# Altium integrated library Tact_Switches_rev15a.intlib: 108 symbols (continued)
## WE-Tact Switches WS-TASV 431183015816
designator SW?
WS-TASV SMD Tact Switch 5X5 mm with ground terminal; Manufacturer: Würth Elektronik eiSos GmbH & Co.KG; ComponentLink1 Description: Manufacturer; ComponentLink2 Description: Datasheet; Creat by: Karrer Zheng; NoPins: 04; Creat Date: 5 March February 2014; partNo: 431183015816; ComponentLink1URL: http://www.we-online.com; ComponentLink2URL: http://katalog.we-online.de/em/datasheet/431183015816.pdf
footprint 431183015816
pins: 1, 2, 3, 4, 5, 6
text: GND


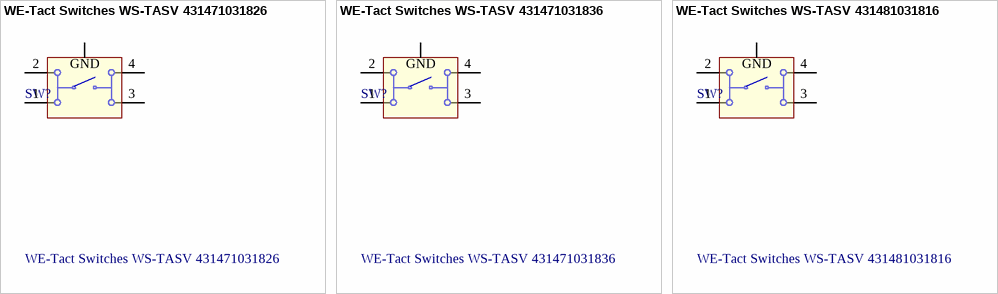
[diagram p10: symbols WE-Tact Switches WS-TASV 431471031826 to WE-Tact Switches WS-TASV 431481031816]

## WE-Tact Switches WS-TASV 431471031826
designator SW?
WS-TASV SMD Tact Switch 6X6 mm with ground terminal; Manufacturer: Würth Elektronik eiSos GmbH & Co.KG; ComponentLink1 Description: Manufacturer; ComponentLink2 Description: Datasheet; Creat by: Karrer Zheng; NoPins: 04; Creat Date: 4 March February 2014; partNo: 431471031826; ComponentLink1URL: http://www.we-online.com; ComponentLink2URL: http://katalog.we-online.de/em/datasheet/431471031826.pdf
footprint 431471031826 (6*6mm vertical type, SMD, height 3.1mm, white actuator, 260gf, Grounded Terminal, T&R)
pins: 1, 2, 3, 4, 5
text: GND

## WE-Tact Switches WS-TASV 431471031836
designator SW?
WS-TASV SMD Tact Switch 6X6 mm with ground terminal; Manufacturer: Würth Elektronik eiSos GmbH & Co.KG; ComponentLink1 Description: Manufacturer; ComponentLink2 Description: Datasheet; Creat by: Karrer Zheng; NoPins: 04; Creat Date: 4 March February 2014; partNo: 431471031836; ComponentLink1URL: http://www.we-online.com; ComponentLink2URL: http://katalog.we-online.de/em/datasheet/431471031836.pdf
footprint 431471031836 (6*6mm vertical type, SMD, height 3.1mm, salmon actuator, 360gf, Grounded Terminal, T&R)
pins: 1, 2, 3, 4, 5
text: GND

## WE-Tact Switches WS-TASV 431481031816
designator SW?
WS-TASV SMD Tact Switch 6X6 mm with ground terminal; Manufacturer: Würth Elektronik eiSos GmbH & Co.KG; ComponentLink1 Description: Manufacturer; ComponentLink2 Description: Datasheet; Creat by: Karrer Zheng; NoPins: 04; Creat Date: 4 March February 2014; partNo: 431481031816; ComponentLink1URL: http://www.we-online.com; ComponentLink2URL: http://katalog.we-online.de/em/datasheet/431481031816.pdf
footprint 431481031816 (6*6mm vertical type, SMD, height 3.1mm, black actuator, 160gf, Grounded Terminal, T&R)
pins: 1, 2, 3, 4, 5
text: GND


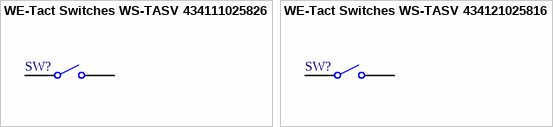
[diagram p11: symbols WE-Tact Switches WS-TASV 434111025826 to WE-Tact Switches WS-TASV 434121025816]

## WE-Tact Switches WS-TASV 434111025826
designator SW?
WS-TASV SMD Tact Switch 6.0X3.8 mm; Manufacturer: Würth Elektronik eiSos GmbH & Co.KG; ComponentLink1 Description: Manufacturer; ComponentLink2 Description: Datasheet; Creat by: Karrer Zheng; NoPins: 02; Creat Date: 6 March February 2014; partNo: 434111025826; ComponentLink1URL: http://www.we-online.com; ComponentLink2URL: http://katalog.we-online.de/em/datasheet/434111025826.pdf
footprint 434111025826 (6.0*3.8mm vertical type, SMD,  height 2.5mm, white actuator, 260gf, T&R)
pins: 1, 2

## WE-Tact Switches WS-TASV 434121025816
designator SW?
WS-TASV SMD Tact Switch 6.0X3.8 mm; Manufacturer: Würth Elektronik eiSos GmbH & Co.KG; ComponentLink1 Description: Manufacturer; ComponentLink2 Description: Datasheet; Creat by: Karrer Zheng; NoPins: 02; Creat Date: 6 March February 2014; partNo: 434121025816; ComponentLink1URL: http://www.we-online.com; ComponentLink2URL: http://katalog.we-online.de/em/datasheet/434121025816.pdf
footprint 434121025816 (6.0*3.8mm vertical type, SMD, height 2.5mm, black actuator, 160gf, T&R)
pins: 1, 2


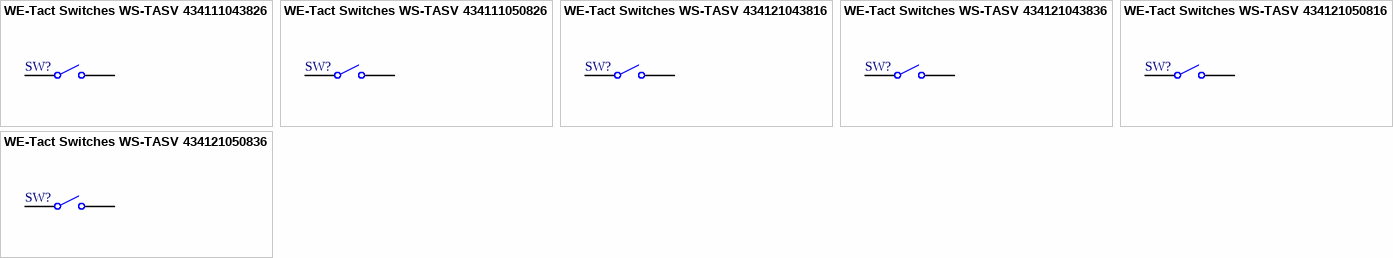
[diagram p12: symbols WE-Tact Switches WS-TASV 434111043826 to WE-Tact Switches WS-TASV 434121050836]

## WE-Tact Switches WS-TASV 434111043826
designator SW?
WS-TASV SMD Tact Switch 6.0X3.5 mm; Manufacturer: Würth Elektronik eiSos GmbH & Co.KG; ComponentLink1 Description: Manufacturer; ComponentLink2 Description: Datasheet; Creat by: Karrer Zheng; NoPins: 02; Creat Date: 5 March February 2014; partNo: 434111043826; ComponentLink1URL: http://www.we-online.com; ComponentLink2URL: http://katalog.we-online.de/em/datasheet/434111043826.pdf
footprint 434111043826
pins: 1, 2

## WE-Tact Switches WS-TASV 434111050826
designator SW?
WS-TASV SMD Tact Switch 6.0X3.5 mm; Manufacturer: Würth Elektronik eiSos GmbH & Co.KG; ComponentLink1 Description: Manufacturer; ComponentLink2 Description: Datasheet; Creat by: Karrer Zheng; NoPins: 02; Creat Date: 5 March February 2014; partNo: 434111050826; ComponentLink1URL: http://www.we-online.com; ComponentLink2URL: http://katalog.we-online.de/em/datasheet/434111050826.pdf
footprint 434111050826
pins: 1, 2

## WE-Tact Switches WS-TASV 434121043816
designator SW?
WS-TASV SMD Tact Switch 6.0X3.5 mm; Manufacturer: Würth Elektronik eiSos GmbH & Co.KG; ComponentLink1 Description: Manufacturer; ComponentLink2 Description: Datasheet; Creat by: Karrer Zheng; NoPins: 02; Creat Date: 5 March February 2014; partNo: 434121043816; ComponentLink1URL: http://www.we-online.com; ComponentLink2URL: http://katalog.we-online.de/em/datasheet/434121043816.pdf
footprint 434121043816
pins: 1, 2

## WE-Tact Switches WS-TASV 434121043836
designator SW?
WS-TASV SMD Tact Switch 6.0X3.5 mm; Manufacturer: Würth Elektronik eiSos GmbH & Co.KG; ComponentLink1 Description: Manufacturer; ComponentLink2 Description: Datasheet; Creat by: Karrer Zheng; NoPins: 02; Creat Date: 5 March February 2014; partNo: 434121043836; ComponentLink1URL: http://www.we-online.com; ComponentLink2URL: http://katalog.we-online.de/em/datasheet/434121043836.pdf
footprint 434121043836
pins: 1, 2

## WE-Tact Switches WS-TASV 434121050816
designator SW?
WS-TASV SMD Tact Switch 6.0X3.5 mm; Manufacturer: Würth Elektronik eiSos GmbH & Co.KG; ComponentLink1 Description: Manufacturer; ComponentLink2 Description: Datasheet; Creat by: Karrer Zheng; NoPins: 02; Creat Date: 5 March February 2014; partNo: 434121050816; ComponentLink1URL: http://www.we-online.com; ComponentLink2URL: http://katalog.we-online.de/em/datasheet/434121050816.pdf
footprint 434121050816
pins: 1, 2

## WE-Tact Switches WS-TASV 434121050836
designator SW?
WS-TASV SMD Tact Switch 6.0X3.5 mm; Manufacturer: Würth Elektronik eiSos GmbH & Co.KG; ComponentLink1 Description: Manufacturer; ComponentLink2 Description: Datasheet; Creat by: Karrer Zheng; NoPins: 04; Creat Date: 5 March February 2014; partNo: 434121050836; ComponentLink1URL: http://www.we-online.com; ComponentLink2URL: http://katalog.we-online.de/em/datasheet/434121050836.pdf
footprint 434121050836
pins: 1, 2


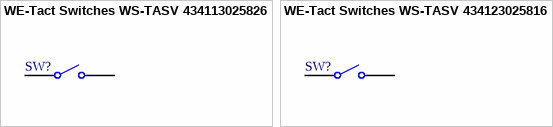
[diagram p13: symbols WE-Tact Switches WS-TASV 434113025826 to WE-Tact Switches WS-TASV 434123025816]

## WE-Tact Switches WS-TASV 434113025826
designator SW?
WS-TASV J-Bend SMD Tact Switch 6.0X3.8 mm; Manufacturer: Würth Elektronik eiSos GmbH & Co.KG; ComponentLink1 Description: Manufacturer; ComponentLink2 Description: Datasheet; Creat by: Karrer Zheng; NoPins: 02; Creat Date: 6 March February 2014; partNo: 434113025826; ComponentLink1URL: http://www.we-online.com; ComponentLink2URL: http://katalog.we-online.de/em/datasheet/434113025826.pdf
footprint 434113025826
pins: 1, 2

## WE-Tact Switches WS-TASV 434123025816
designator SW?
WS-TASV J-Bend SMD Tact Switch 6.0X3.8 mm; Manufacturer: Würth Elektronik eiSos GmbH & Co.KG; ComponentLink1 Description: Manufacturer; ComponentLink2 Description: Datasheet; Creat by: Karrer Zheng; NoPins: 02; Creat Date: 6 March February 2014; partNo: 434123025816; ComponentLink1URL: http://www.we-online.com; ComponentLink2URL: http://katalog.we-online.de/em/datasheet/434123025816.pdf
footprint 434123025816
pins: 1, 2


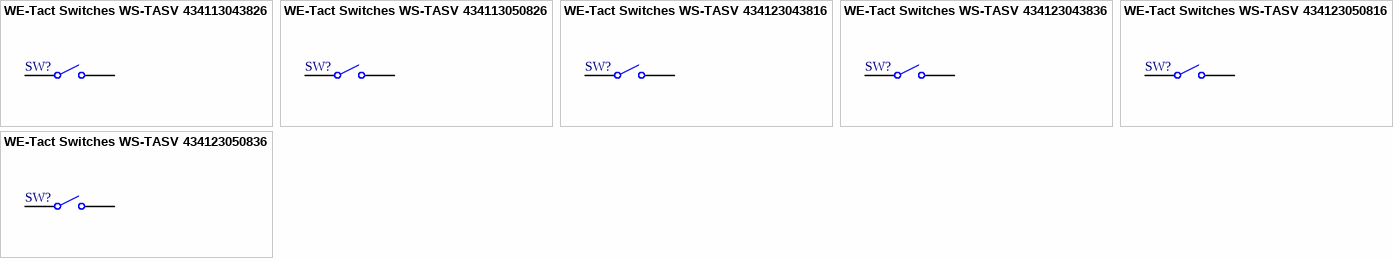
[diagram p14: symbols WE-Tact Switches WS-TASV 434113043826 to WE-Tact Switches WS-TASV 434123050836]

## WE-Tact Switches WS-TASV 434113043826
designator SW?
WS-TASV J-Bend SMD Tact Switch 6.0X3.5 mm; Manufacturer: Würth Elektronik eiSos GmbH & Co.KG; ComponentLink1 Description: Manufacturer; ComponentLink2 Description: Datasheet; Creat by: Karrer Zheng; NoPins: 02; Creat Date: 5 March February 2014; partNo: 434113043826; ComponentLink1URL: http://www.we-online.com; ComponentLink2URL: http://katalog.we-online.de/em/datasheet/434113043826.pdf
footprint 434113043826 (6.0*3.5mm vertical type, J-Bend SMD, height 4.3mm, white actuator, 260gf, T&R)
pins: 1, 2

## WE-Tact Switches WS-TASV 434113050826
designator SW?
WS-TASV J-Bend SMD Tact Switch 6.0X3.5 mm; Manufacturer: Würth Elektronik eiSos GmbH & Co.KG; ComponentLink1 Description: Manufacturer; ComponentLink2 Description: Datasheet; Creat by: Karrer Zheng; NoPins: 02; Creat Date: 5 March February 2014; partNo: 434113050826; ComponentLink1URL: http://www.we-online.com; ComponentLink2URL: http://katalog.we-online.de/em/datasheet/434113050826.pdf
footprint 434113050826 (6.0*3.5mm vertical type, J-Bend SMD, height 5.0mm, white actuator, 260gf, T&R)
pins: 1, 2

## WE-Tact Switches WS-TASV 434123043816
designator SW?
WS-TASV J-Bend SMD Tact Switch 6.0X3.5 mm; Manufacturer: Würth Elektronik eiSos GmbH & Co.KG; ComponentLink1 Description: Manufacturer; ComponentLink2 Description: Datasheet; Creat by: Karrer Zheng; NoPins: 02; Creat Date: 5 March February 2014; partNo: 434123043816; ComponentLink1URL: http://www.we-online.com; ComponentLink2URL: http://katalog.we-online.de/em/datasheet/434123043816.pdf
footprint 434123043816 (6.0*3.5mm vertical type, J-Bend SMD, height 4.3mm, black actuator, 160gf, T&R)
pins: 1, 2

## WE-Tact Switches WS-TASV 434123043836
designator SW?
WS-TASV J-Bend SMD Tact Switch 6.0X3.5 mm; Manufacturer: Würth Elektronik eiSos GmbH & Co.KG; ComponentLink1 Description: Manufacturer; ComponentLink2 Description: Datasheet; Creat by: Karrer Zheng; NoPins: 02; Creat Date: 5 March February 2014; partNo: 434123043836; ComponentLink1URL: http://www.we-online.com; ComponentLink2URL: http://katalog.we-online.de/em/datasheet/434123043836.pdf
footprint 434123043836 (6.0*3.5mm vertical type, J-Bend SMD,  height 4.3mm, salmon actuator, 360gf, T&R)
pins: 1, 2

## WE-Tact Switches WS-TASV 434123050816
designator SW?
WS-TASV J-Bend SMD Tact Switch 6.0X3.5 mm; Manufacturer: Würth Elektronik eiSos GmbH & Co.KG; ComponentLink1 Description: Manufacturer; ComponentLink2 Description: Datasheet; Creat by: Karrer Zheng; NoPins: 02; Creat Date: 5 March February 2014; partNo: 434123050816; ComponentLink1URL: http://www.we-online.com; ComponentLink2URL: http://katalog.we-online.de/em/datasheet/434123050816.pdf
footprint 434123050816 (6.0*3.5mm vertical type, J-Bend SMD, height 5.0mm, black actuator, 160gf, T&R)
pins: 1, 2

## WE-Tact Switches WS-TASV 434123050836
designator SW?
WS-TASV J-Bend SMD Tact Switch 6.0X3.5 mm; Manufacturer: Würth Elektronik eiSos GmbH & Co.KG; ComponentLink1 Description: Manufacturer; ComponentLink2 Description: Datasheet; Creat by: Karrer Zheng; NoPins: 02; Creat Date: 5 March February 2014; partNo: 434123050836; ComponentLink1URL: http://www.we-online.com; ComponentLink2URL: http://katalog.we-online.de/em/datasheet/434123050836.pdf
footprint 434123050836 (6.0*3.5mm vertical type, J-Bend SMD, height 5.0mm, salmon actuator, 360gf, T&R)
pins: 1, 2


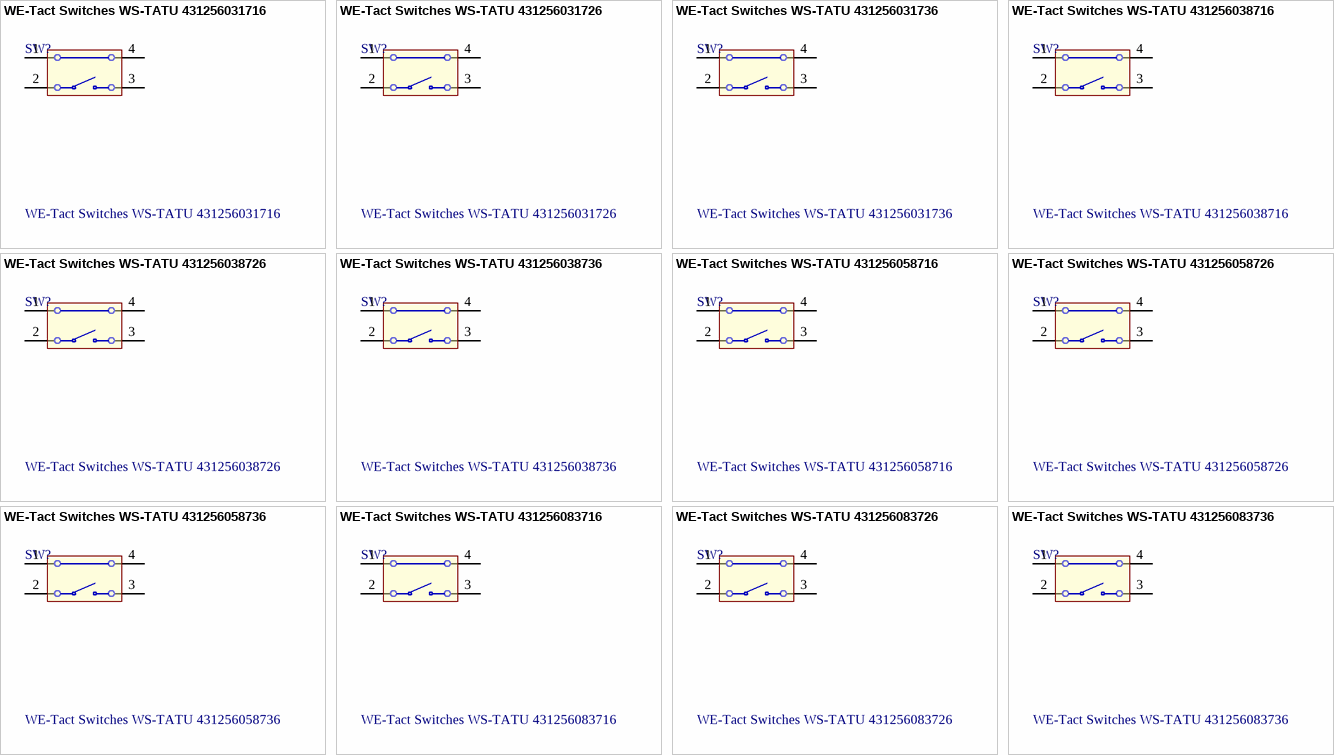
[diagram p15: symbols WE-Tact Switches WS-TATU 431256031716 to WE-Tact Switches WS-TATU 431256083736]

## WE-Tact Switches WS-TATU 431256031716
designator SW?
WS-TATU THT Tact Switch 6X6 mm right angle type with ground terminal; Manufacturer: Würth Elektronik eiSos GmbH & Co.KG; ComponentLink1 Description: Manufacturer; ComponentLink2 Description: Datasheet; Creat by: Karrer Zheng; NoPins: 04; Creat Date: 03 March 2014; partNo: 431256031716; ComponentLink1URL: http://www.we-online.com; ComponentLink2URL: http://katalog.we-online.de/em/datasheet/43125603x.pdf
footprint 431256031716 (6*6mm right-angled,THT, height 3.15mm, black actuator, 160gf, Bulk)
pins: 1, 2, 3, 4

## WE-Tact Switches WS-TATU 431256031726
designator SW?
WS-TATU THT Tact Switch 6X6 mm right angle type with ground terminal; Manufacturer: Würth Elektronik eiSos GmbH & Co.KG; ComponentLink1 Description: Manufacturer; ComponentLink2 Description: Datasheet; Creat by: Karrer Zheng; NoPins: 04; Creat Date: 03 March 2014; partNo: 431256031726; ComponentLink1URL: http://www.we-online.com; ComponentLink2URL: http://katalog.we-online.de/em/datasheet/43125603x.pdf
footprint 431256031726 (6*6mm right-angled,THT, height 3.15mm, white actuator, 260gf, Bulk)
pins: 1, 2, 3, 4

## WE-Tact Switches WS-TATU 431256031736
designator SW?
WS-TATU THT Tact Switch 6X6 mm right angle type with ground terminal; Manufacturer: Würth Elektronik eiSos GmbH & Co.KG; ComponentLink1 Description: Manufacturer; ComponentLink2 Description: Datasheet; Creat by: Karrer Zheng; NoPins: 04; Creat Date: 03 March 2014; partNo: 431256031736; ComponentLink1URL: http://www.we-online.com; ComponentLink2URL: http://katalog.we-online.de/em/datasheet/43125603x.pdf
footprint 431256031736 (6*6mm right-angled,THT, height 3.15mm, salmon actuator, 360gf, Bulk)
pins: 1, 2, 3, 4

## WE-Tact Switches WS-TATU 431256038716
designator SW?
WS-TATU THT Tact Switch 6X6 mm right angle type with ground terminal; Manufacturer: Würth Elektronik eiSos GmbH & Co.KG; ComponentLink1 Description: Manufacturer; ComponentLink2 Description: Datasheet; Creat by: Karrer Zheng; NoPins: 04; Creat Date: 03 March 2014; partNo: 431256038716; ComponentLink1URL: http://www.we-online.com; ComponentLink2URL: http://katalog.we-online.de/em/datasheet/43125603x.pdf
footprint 431256038716 (6*6mm right-angled,THT, height 3.85mm, black actuator, 160gf, Bulk)
pins: 1, 2, 3, 4

## WE-Tact Switches WS-TATU 431256038726
designator SW?
WS-TATU THT Tact Switch 6X6 mm right angle type with ground terminal; Manufacturer: Würth Elektronik eiSos GmbH & Co.KG; ComponentLink1 Description: Manufacturer; ComponentLink2 Description: Datasheet; Creat by: Karrer Zheng; NoPins: 04; Creat Date: 03 March 2014; partNo: 431256038726; ComponentLink1URL: http://www.we-online.com; ComponentLink2URL: http://katalog.we-online.de/em/datasheet/43125603x.pdf
footprint 431256038726 (6*6mm right-angled,THT, height 3.85mm, white actuator, 260gf, Bulk)
pins: 1, 2, 3, 4

## WE-Tact Switches WS-TATU 431256038736
designator SW?
WS-TATU THT Tact Switch 6X6 mm right angle type with ground terminal; Manufacturer: Würth Elektronik eiSos GmbH & Co.KG; ComponentLink1 Description: Manufacturer; ComponentLink2 Description: Datasheet; Creat by: Karrer Zheng; NoPins: 04; Creat Date: 03 March 2014; partNo: 431256038736; ComponentLink1URL: http://www.we-online.com; ComponentLink2URL: http://katalog.we-online.de/em/datasheet/43125603x.pdf
footprint 431256038736 (6*6mm right-angled,THT, height 3.85mm, salmon actuator, 360gf, Bulk)
pins: 1, 2, 3, 4

## WE-Tact Switches WS-TATU 431256058716
designator SW?
WS-TATU THT Tact Switch 6X6 mm right angle type with ground terminal; Manufacturer: Würth Elektronik eiSos GmbH & Co.KG; ComponentLink1 Description: Manufacturer; ComponentLink2 Description: Datasheet; Creat by: Karrer Zheng; NoPins: 04; Creat Date: 03 March 2014; partNo: 431256058716; ComponentLink1URL: http://www.we-online.com; ComponentLink2URL: http://katalog.we-online.de/em/datasheet/43125603x.pdf
footprint 431256058716 (6*6mm right angle Tact switch,THT, height 5.85mm, black actuator, 160gf, Bulk)
pins: 1, 2, 3, 4

## WE-Tact Switches WS-TATU 431256058726
designator SW?
WS-TATU THT Tact Switch 6X6 mm right angle type with ground terminal; Manufacturer: Würth Elektronik eiSos GmbH & Co.KG; ComponentLink1 Description: Manufacturer; ComponentLink2 Description: Datasheet; Creat by: Karrer Zheng; NoPins: 04; Creat Date: 03 March 2014; partNo: 431256058726; ComponentLink1URL: http://www.we-online.com; ComponentLink2URL: http://katalog.we-online.de/em/datasheet/43125603x.pdf
footprint 431256058726 (6*6mm right angle Tact switch,THT, height 5.85mm, white actuator, 260gf, Bulk)
pins: 1, 2, 3, 4

## WE-Tact Switches WS-TATU 431256058736
designator SW?
WS-TATU THT Tact Switch 6X6 mm right angle type with ground terminal; Manufacturer: Würth Elektronik eiSos GmbH & Co.KG; ComponentLink1 Description: Manufacturer; ComponentLink2 Description: Datasheet; Creat by: Karrer Zheng; NoPins: 04; Creat Date: 03 March 2014; partNo: 431256058736; ComponentLink1URL: http://www.we-online.com; ComponentLink2URL: http://katalog.we-online.de/em/datasheet/43125603x.pdf
footprint 431256058736 (6*6mm right angle Tact switch,THT, height 5.85mm, salmon actuator, 360gf, Bulk)
pins: 1, 2, 3, 4

## WE-Tact Switches WS-TATU 431256083716
designator SW?
WS-TATU THT Tact Switch 6X6 mm right angle type with ground terminal; Manufacturer: Würth Elektronik eiSos GmbH & Co.KG; ComponentLink1 Description: Manufacturer; ComponentLink2 Description: Datasheet; Creat by: Karrer Zheng; NoPins: 04; Creat Date: 03 March 2014; partNo: 431256083716; ComponentLink1URL: http://www.we-online.com; ComponentLink2URL: http://katalog.we-online.de/em/datasheet/43125603x.pdf
footprint 431256083716 (6*6mm right angle Tact switch,THT, height 8.35mm, black actuator, 160gf, Bulk)
pins: 1, 2, 3, 4

## WE-Tact Switches WS-TATU 431256083726
designator SW?
WS-TATU THT Tact Switch 6X6 mm right angle type with ground terminal; Manufacturer: Würth Elektronik eiSos GmbH & Co.KG; ComponentLink1 Description: Manufacturer; ComponentLink2 Description: Datasheet; Creat by: Karrer Zheng; NoPins: 04; Creat Date: 03 March 2014; partNo: 431256083726; ComponentLink1URL: http://www.we-online.com; ComponentLink2URL: http://katalog.we-online.de/em/datasheet/43125603x.pdf
footprint 431256083726 (6*6mm right angle Tact switch,THT, height 8.35mm, white actuator, 260gf, Bulk)
pins: 1, 2, 3, 4

## WE-Tact Switches WS-TATU 431256083736
designator SW?
WS-TATU THT Tact Switch 6X6 mm right angle type with ground terminal; Manufacturer: Würth Elektronik eiSos GmbH & Co.KG; ComponentLink1 Description: Manufacturer; ComponentLink2 Description: Datasheet; Creat by: Karrer Zheng; NoPins: 04; Creat Date: 03 March 2014; partNo: 431256083736; ComponentLink1URL: http://www.we-online.com; ComponentLink2URL: http://katalog.we-online.de/em/datasheet/43125603x.pdf
footprint 431256083736 (6*6mm right angle Tact switch,THT, height 8.35mm, salmon actuator, 360gf, Bulk)
pins: 1, 2, 3, 4


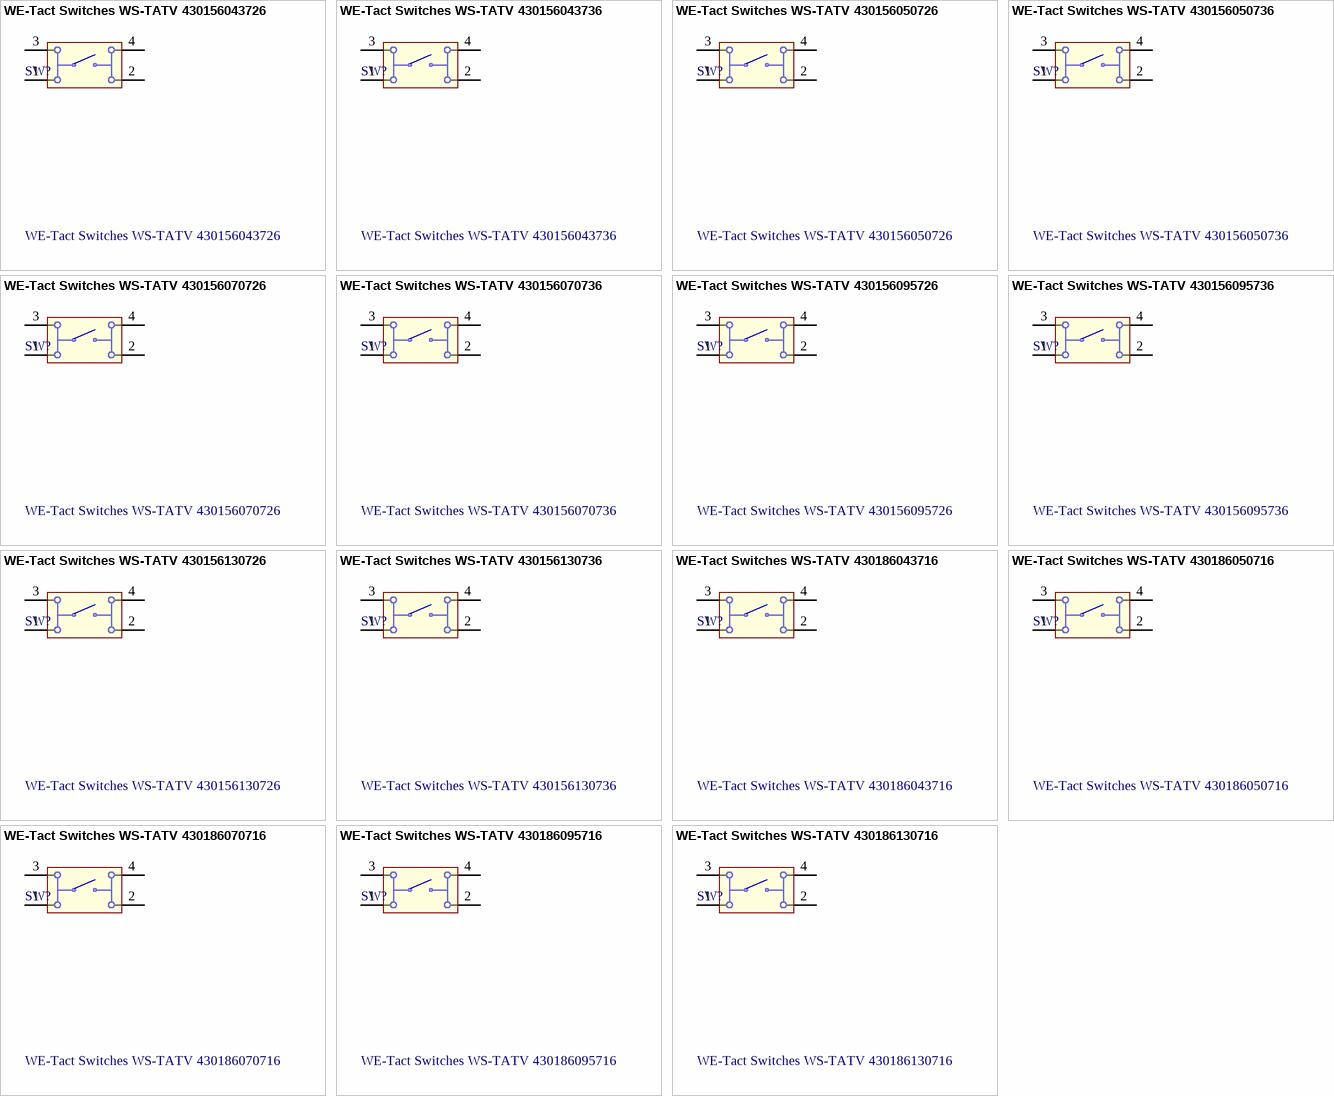
[diagram p16: symbols WE-Tact Switches WS-TATV 430156043726 to WE-Tact Switches WS-TATV 430186130716]

## WE-Tact Switches WS-TATV 430156043726
designator SW?
WS-TATV THT Tact Switch 6X6 mm; Manufacturer: Würth Elektronik eiSos GmbH & Co.KG; ComponentLink1 Description: Manufacturer; ComponentLink2 Description: Datasheet; Creat by: Karrer Zheng; NoPins: 04; Creat Date: 03 March 2014; partNo: 430156043726; ComponentLink1URL: http://www.we-online.com; ComponentLink2URL: http://katalog.we-online.de/em/datasheet/4301x6.pdf
footprint 430156043726 (6*6mm vertical type, THT, height 4.3mm, white actuator, 260gf, Bulk)
pins: 1, 2, 3, 4

## WE-Tact Switches WS-TATV 430156043736
designator SW?
WS-TATV THT Tact Switch 6X6 mm; Manufacturer: Würth Elektronik eiSos GmbH & Co.KG; ComponentLink1 Description: Manufacturer; ComponentLink2 Description: Datasheet; Creat by: Karrer Zheng; NoPins: 04; Creat Date: 03 March 2014; partNo: 430156043736; ComponentLink1URL: http://www.we-online.com; ComponentLink2URL: http://katalog.we-online.de/em/datasheet/4301x6.pdf
footprint 430156043736 (6*6mm vertical type, THT, height 4.3mm, salmon actuator 360gf, Bulk)
pins: 1, 2, 3, 4

## WE-Tact Switches WS-TATV 430156050726
designator SW?
WS-TATV THT Tact Switch 6X6 mm; Manufacturer: Würth Elektronik eiSos GmbH & Co.KG; ComponentLink1 Description: Manufacturer; ComponentLink2 Description: Datasheet; Creat by: Karrer Zheng; NoPins: 04; Creat Date: 03 March 2014; partNo: 430156050726; ComponentLink1URL: http://www.we-online.com; ComponentLink2URL: http://katalog.we-online.de/em/datasheet/4301x6.pdf
footprint 430156050726 (6*6mm vertical type, THT, height 5.0mm, white actuator, 260gf, Bulk)
pins: 1, 2, 3, 4

## WE-Tact Switches WS-TATV 430156050736
designator SW?
WS-TATV THT Tact Switch 6X6 mm; Manufacturer: Würth Elektronik eiSos GmbH & Co.KG; ComponentLink1 Description: Manufacturer; ComponentLink2 Description: Datasheet; Creat by: Karrer Zheng; NoPins: 04; Creat Date: 03 March 2014; partNo: 430156050736; ComponentLink1URL: http://www.we-online.com; ComponentLink2URL: http://katalog.we-online.de/em/datasheet/4301x6.pdf
footprint 430156050736 (6*6mm vertical type, THT, height 5.0mm, salmon actuator, 360gf, Bulk)
pins: 1, 2, 3, 4

## WE-Tact Switches WS-TATV 430156070726
designator SW?
WS-TATV THT Tact Switch 6X6 mm; Manufacturer: Würth Elektronik eiSos GmbH & Co.KG; ComponentLink1 Description: Manufacturer; ComponentLink2 Description: Datasheet; Creat by: Karrer Zheng; NoPins: 04; Creat Date: 03 March 2014; partNo: 430156070726; ComponentLink1URL: http://www.we-online.com; ComponentLink2URL: http://katalog.we-online.de/em/datasheet/4301x6.pdf
footprint 430156070726 (6*6mm vertical type, THT, height 7.0mm, white actuator, 260gf, Bulk)
pins: 1, 2, 3, 4

## WE-Tact Switches WS-TATV 430156070736
designator SW?
WS-TATV THT Tact Switch 6X6 mm; Manufacturer: Würth Elektronik eiSos GmbH & Co.KG; ComponentLink1 Description: Manufacturer; ComponentLink2 Description: Datasheet; Creat by: Karrer Zheng; NoPins: 04; Creat Date: 03 March 2014; partNo: 430156070736; ComponentLink1URL: http://www.we-online.com; ComponentLink2URL: http://katalog.we-online.de/em/datasheet/4301x6.pdf
footprint 430156070736 (6*6mm vertical type, THT, height 7.0mm, salmon actuator, 360gf, Bulk)
pins: 1, 2, 3, 4

## WE-Tact Switches WS-TATV 430156095726
designator SW?
WS-TATV THT Tact Switch 6X6 mm; Manufacturer: Würth Elektronik eiSos GmbH & Co.KG; ComponentLink1 Description: Manufacturer; ComponentLink2 Description: Datasheet; Creat by: Karrer Zheng; NoPins: 04; Creat Date: 03 March 2014; partNo: 430156095726; ComponentLink1URL: http://www.we-online.com; ComponentLink2URL: http://katalog.we-online.de/em/datasheet/4301x6.pdf
footprint 430156095726 (6*6mm vertical type, THT, height 9.5mm, white actuator, 260gf, Bulk)
pins: 1, 2, 3, 4

## WE-Tact Switches WS-TATV 430156095736
designator SW?
WS-TATV THT Tact Switch 6X6 mm; Manufacturer: Würth Elektronik eiSos GmbH & Co.KG; ComponentLink1 Description: Manufacturer; ComponentLink2 Description: Datasheet; Creat by: Karrer Zheng; NoPins: 04; Creat Date: 03 March 2014; partNo: 430156095736; ComponentLink1URL: http://www.we-online.com; ComponentLink2URL: http://katalog.we-online.de/em/datasheet/4301x6.pdf
footprint 430156095736 (6*6mm vertical type, THT, height 9.5mm, salmon actuator, 360gf, Bulk)
pins: 1, 2, 3, 4

## WE-Tact Switches WS-TATV 430156130726
designator SW?
WS-TATV THT Tact Switch 6X6 mm; Manufacturer: Würth Elektronik eiSos GmbH & Co.KG; ComponentLink1 Description: Manufacturer; ComponentLink2 Description: Datasheet; Creat by: Karrer Zheng; NoPins: 04; Creat Date: 03 March 2014; partNo: 430156130726; ComponentLink1URL: http://www.we-online.com; ComponentLink2URL: http://katalog.we-online.de/em/datasheet/4301x6.pdf
footprint 430156130726 (6*6mm vertical type, THT, height 13.0mm, white actuator, 260gf, Bulk)
pins: 1, 2, 3, 4

## WE-Tact Switches WS-TATV 430156130736
designator SW?
WS-TATV THT Tact Switch 6X6 mm; Manufacturer: Würth Elektronik eiSos GmbH & Co.KG; ComponentLink1 Description: Manufacturer; ComponentLink2 Description: Datasheet; Creat by: Karrer Zheng; NoPins: 04; Creat Date: 03 March 2014; partNo: 430156130736; ComponentLink1URL: http://www.we-online.com; ComponentLink2URL: http://katalog.we-online.de/em/datasheet/4301x6.pdf
footprint 430156130736 (6*6mm vertical type, THT, height 13.0mm, salmon actuator, 360gf, Bulk)
pins: 1, 2, 3, 4

## WE-Tact Switches WS-TATV 430186043716
designator SW?
WS-TATV THT Tact Switch 6X6 mm; Manufacturer: Würth Elektronik eiSos GmbH & Co.KG; ComponentLink1 Description: Manufacturer; ComponentLink2 Description: Datasheet; Creat by: Karrer Zheng; NoPins: 04; Creat Date: 03 March 2014; partNo: 430186043716; ComponentLink1URL: http://www.we-online.com; ComponentLink2URL: http://katalog.we-online.de/em/datasheet/4301x6.pdf
footprint 430186043716 (6*6mm vertical type, THT, height 4.3mm, black actuator, 160gf, Bulk)
pins: 1, 2, 3, 4

## WE-Tact Switches WS-TATV 430186050716
designator SW?
WS-TATV THT Tact Switch 6X6 mm; Manufacturer: Würth Elektronik eiSos GmbH & Co.KG; ComponentLink1 Description: Manufacturer; ComponentLink2 Description: Datasheet; Creat by: Karrer Zheng; NoPins: 04; Creat Date: 03 March 2014; partNo: 430186050716; ComponentLink1URL: http://www.we-online.com; ComponentLink2URL: http://katalog.we-online.de/em/datasheet/4301x6.pdf
footprint 430186050716 (6*6mm vertical type, THT, height 5.0mm, black actuator, 160gf, Bulk)
pins: 1, 2, 3, 4

## WE-Tact Switches WS-TATV 430186070716
designator SW?
WS-TATV THT Tact Switch 6X6 mm; Manufacturer: Würth Elektronik eiSos GmbH & Co.KG; ComponentLink1 Description: Manufacturer; ComponentLink2 Description: Datasheet; Creat by: Karrer Zheng; NoPins: 04; Creat Date: 03 March 2014; partNo: 430186070716; ComponentLink1URL: http://www.we-online.com; ComponentLink2URL: http://katalog.we-online.de/em/datasheet/4301x6.pdf
footprint 430186070716 (6*6mm vertical type, THT, height 7.0mm, black actuator, 160gf, Bulk)
pins: 1, 2, 3, 4

## WE-Tact Switches WS-TATV 430186095716
designator SW?
WS-TATV THT Tact Switch 6X6 mm; Manufacturer: Würth Elektronik eiSos GmbH & Co.KG; ComponentLink1 Description: Manufacturer; ComponentLink2 Description: Datasheet; Creat by: Karrer Zheng; NoPins: 04; Creat Date: 03 March 2014; partNo: 430186095716; ComponentLink1URL: http://www.we-online.com; ComponentLink2URL: http://katalog.we-online.de/em/datasheet/4301x6.pdf
footprint 430186095716 (6*6mm vertical type, THT, height 9.5mm, black actuator, 160gf, Bulk)
pins: 1, 2, 3, 4

## WE-Tact Switches WS-TATV 430186130716
designator SW?
WS-TATV THT Tact Switch 6X6 mm; Manufacturer: Würth Elektronik eiSos GmbH & Co.KG; ComponentLink1 Description: Manufacturer; ComponentLink2 Description: Datasheet; Creat by: Karrer Zheng; NoPins: 04; Creat Date: 03 March 2014; partNo: 430186130716; ComponentLink1URL: http://www.we-online.com; ComponentLink2URL: http://katalog.we-online.de/em/datasheet/4301x6.pdf
footprint 430186130716 (6*6mm vertical type, THT, height 13.0mm, black actuator, 160gf, Bulk)
pins: 1, 2, 3, 4


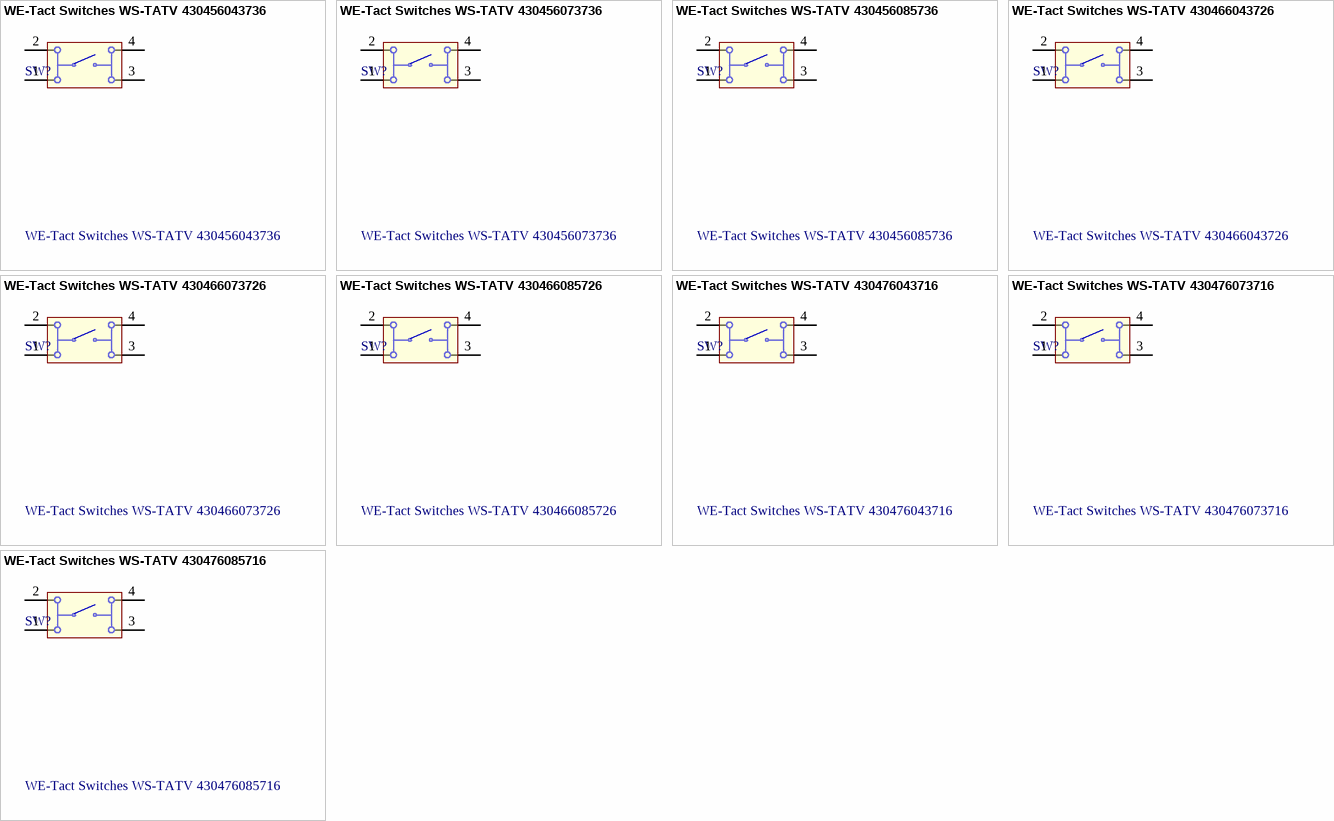
[diagram p17: symbols WE-Tact Switches WS-TATV 430456043736 to WE-Tact Switches WS-TATV 430476085716]

## WE-Tact Switches WS-TATV 430456043736
designator SW?
WS-TATV THT Tact Switch 12X12 mm; Manufacturer: Würth Elektronik eiSos GmbH & Co.KG; ComponentLink1 Description: Manufacturer; ComponentLink2 Description: Datasheet; Creat by: Karrer Zheng; NoPins: 04; Creat Date: 28 February 2014; partNo: 430456043736; ComponentLink1URL: http://www.we-online.com; ComponentLink2URL: http://katalog.we-online.de/em/datasheet/430456043736.pdf
footprint 430456043736 (12*12mm vertical type,THT,  height 4.3mm, salmon actuator, 360gf, Bulk)
pins: 1, 2, 3, 4

## WE-Tact Switches WS-TATV 430456073736
designator SW?
WS-TATV THT Tact Switch 12X12 mm; Manufacturer: Würth Elektronik eiSos GmbH & Co.KG; ComponentLink1 Description: Manufacturer; ComponentLink2 Description: Datasheet; Creat by: Karrer Zheng; NoPins: 04; Creat Date: 28 February 2014; partNo: 430456073736; ComponentLink1URL: http://www.we-online.com; ComponentLink2URL: http://katalog.we-online.de/em/datasheet/430456073736.pdf
footprint 430456073736 (12*12mm vertical type,THT,  height 7.3mm, square salmon actuator, 360gf, Bulk)
pins: 1, 2, 3, 4

## WE-Tact Switches WS-TATV 430456085736
designator SW?
WS-TATV THT Tact Switch 12X12 mm; Manufacturer: Würth Elektronik eiSos GmbH & Co.KG; ComponentLink1 Description: Manufacturer; ComponentLink2 Description: Datasheet; Creat by: Karrer Zheng; NoPins: 04; Creat Date: 28 February 2014; partNo: 430456085736; ComponentLink1URL: http://www.we-online.com; ComponentLink2URL: http://katalog.we-online.de/em/datasheet/430456085736.pdf
footprint 430456085736 (12*12mm vertical type,THT,  height 8.5mm, salmon actuator, 360gf, Bulk)
pins: 1, 2, 3, 4

## WE-Tact Switches WS-TATV 430466043726
designator SW?
WS-TATV THT Tact Switch 12X12 mm; Manufacturer: Würth Elektronik eiSos GmbH & Co.KG; ComponentLink1 Description: Manufacturer; ComponentLink2 Description: Datasheet; Creat by: Karrer Zheng; NoPins: 04; Creat Date: 28 February 2014; partNo: 430466043726; ComponentLink1URL: http://www.we-online.com; ComponentLink2URL: http://katalog.we-online.de/em/datasheet/430466043726.pdf
footprint 430466043726 (12*12mm vertical type,THT,  height 4.3mm, white actuator, 260gf, Bulk)
pins: 1, 2, 3, 4

## WE-Tact Switches WS-TATV 430466073726
designator SW?
WS-TATV THT Tact Switch 12X12 mm; Manufacturer: Würth Elektronik eiSos GmbH & Co.KG; ComponentLink1 Description: Manufacturer; ComponentLink2 Description: Datasheet; Creat by: Karrer Zheng; NoPins: 04; Creat Date: 28 February 2014; partNo: 430466073726; ComponentLink1URL: http://www.we-online.com; ComponentLink2URL: http://katalog.we-online.de/em/datasheet/430466073726.pdf
footprint 430466073726 (12*12mm vertical type,THT,  height 7.3mm, square white actuator, 260gf, Bulk)
pins: 1, 2, 3, 4

## WE-Tact Switches WS-TATV 430466085726
designator SW?
WS-TATV THT Tact Switch 12X12 mm; Manufacturer: Würth Elektronik eiSos GmbH & Co.KG; ComponentLink1 Description: Manufacturer; ComponentLink2 Description: Datasheet; Creat by: Karrer Zheng; NoPins: 04; Creat Date: 28 February 2014; partNo: 430466085726; ComponentLink1URL: http://www.we-online.com; ComponentLink2URL: http://katalog.we-online.de/em/datasheet/430466085726.pdf
footprint 430466085726 (12*12mm vertical type,THT,  height 8.5mm, white actuator, 260gf, Bulk)
pins: 1, 2, 3, 4

## WE-Tact Switches WS-TATV 430476043716
designator SW?
WS-TATV THT Tact Switch 12X12 mm; Manufacturer: Würth Elektronik eiSos GmbH & Co.KG; ComponentLink1 Description: Manufacturer; ComponentLink2 Description: Datasheet; Creat by: Karrer Zheng; NoPins: 04; Creat Date: 28 February 2014; partNo: 430476043716; ComponentLink1URL: http://www.we-online.com; ComponentLink2URL: http://katalog.we-online.de/em/datasheet/430476043716.pdf
footprint 430476043716 (12*12mm vertical type,THT,  height 4.3mm, white actuator, 160gf, Bulk)
pins: 1, 2, 3, 4

## WE-Tact Switches WS-TATV 430476073716
designator SW?
WS-TATV THT Tact Switch 12X12 mm; Manufacturer: Würth Elektronik eiSos GmbH & Co.KG; ComponentLink1 Description: Manufacturer; ComponentLink2 Description: Datasheet; Creat by: Karrer Zheng; NoPins: 04; Creat Date: 28 February 2014; partNo: 430476073716; ComponentLink1URL: http://www.we-online.com; ComponentLink2URL: http://katalog.we-online.de/em/datasheet/430476073716.pdf
footprint 430476073716 (12*12mm vertical type,THT,  height 7.3mm, square black actuator, 160gf, Bulk)
pins: 1, 2, 3, 4

## WE-Tact Switches WS-TATV 430476085716
designator SW?
WS-TATV THT Tact Switch 12X12 mm; Manufacturer: Würth Elektronik eiSos GmbH & Co.KG; ComponentLink1 Description: Manufacturer; ComponentLink2 Description: Datasheet; Creat by: Karrer Zheng; NoPins: 04; Creat Date: 28 February 2014; partNo: 430476085716; ComponentLink1URL: http://www.we-online.com; ComponentLink2URL: http://katalog.we-online.de/em/datasheet/430476085716.pdf
footprint 430476085716 (12*12mm vertical type,THT,  height 8.5mm, black actuator, 160gf, Bulk)
pins: 1, 2, 3, 4